# Altium footprint library Wurth_Elektronik_Electromechanic_Wire_to_Board_Connectors_rev16a.PCBLIB: 662 footprints (part 11 of 42)
Each footprint in its own frame and in the unit in brackets; x right, y up, seen from the top. Pads: shape width x height; smd on the part's side, far side on the other; paste and mask are expansions set on the pad; w line width, h text height; cw(c..) or ccw(c..) is an arc to the next point about the centre after c.
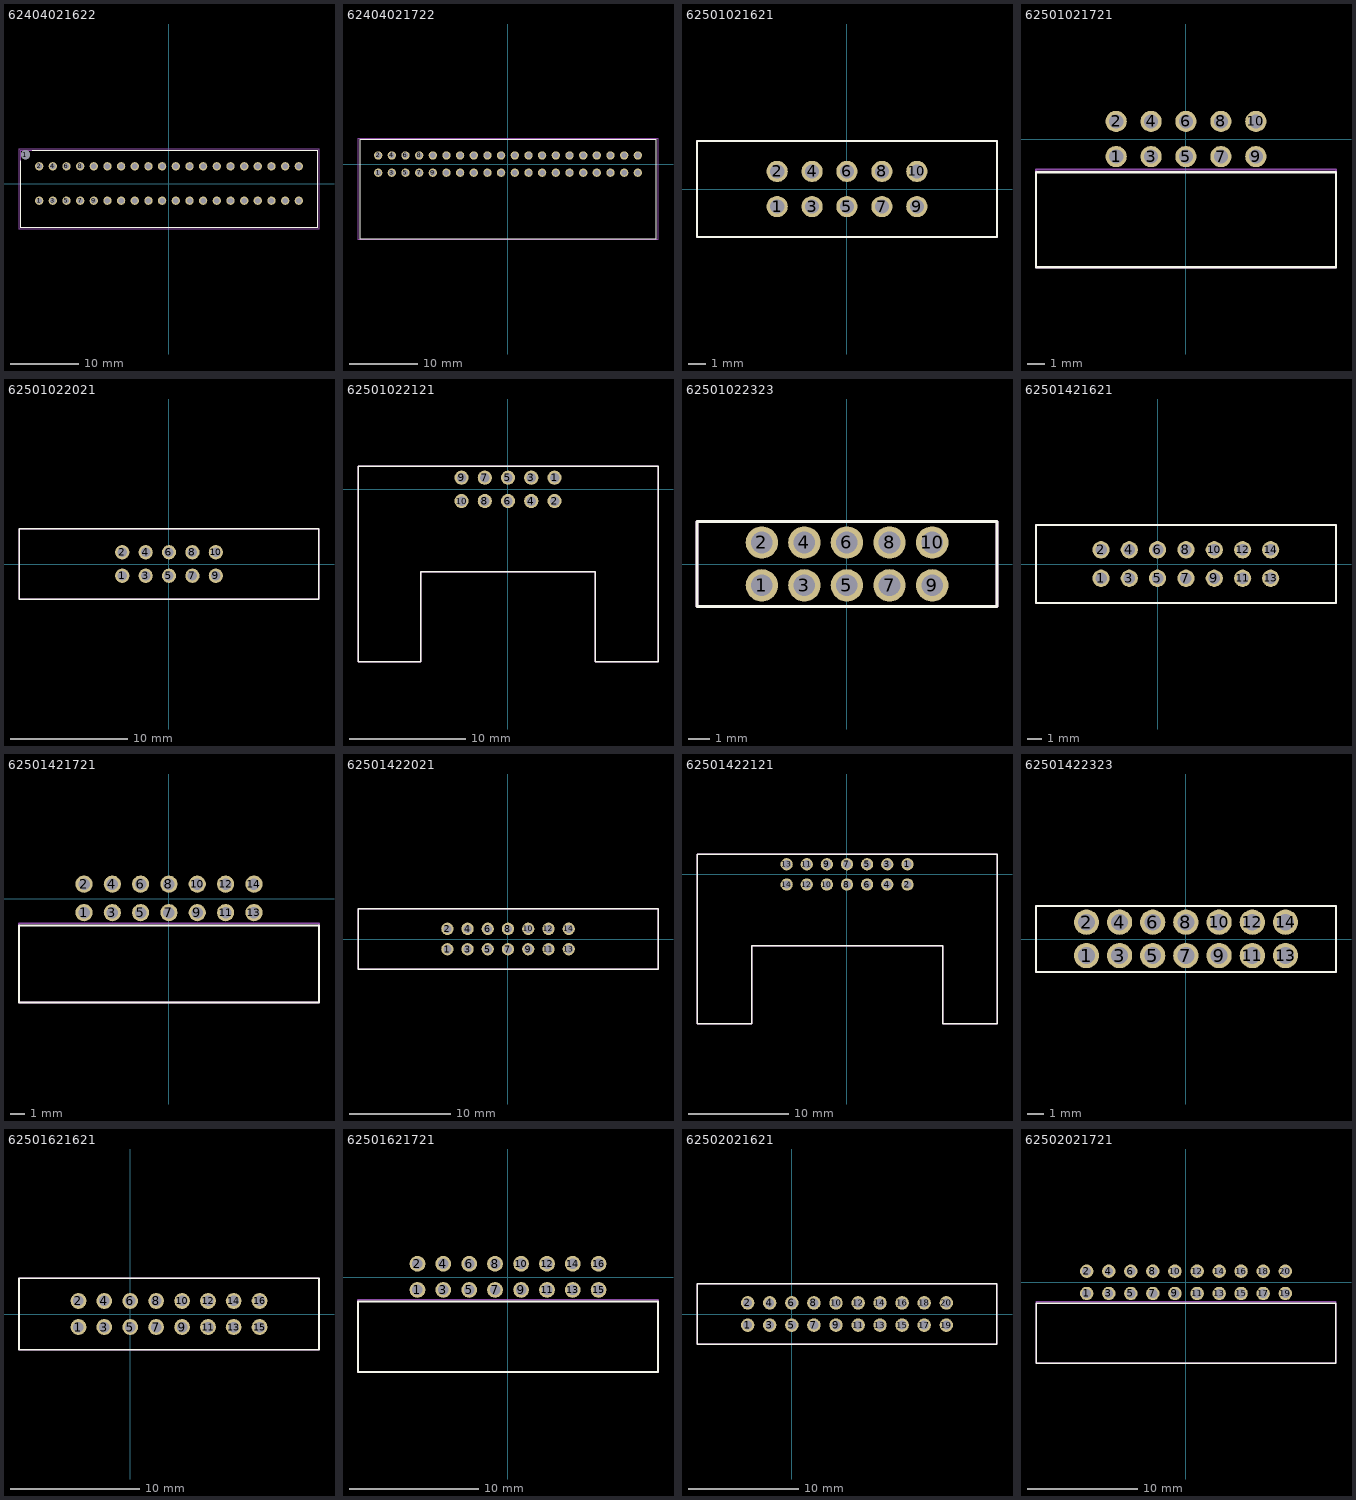
[diagram p10: the footprints below, top view; thin cyan lines are the x and y axes]

## 62404021622 [mil]
pads (41):
  round 52 hole 52: 1(-826.77,166)
  round 48 hole 32: 1(-748.03,-98.43) 2(-748.03,99) 3(-669.29,-98.43) 4(-669.29,99) 5(-590.55,-98.43) 6(-590.55,99) 7(-511.81,-98.43) 8(-511.81,99) 9(-433.07,-98.43) 10(-433.07,99) 11(-354.33,-98.43) 12(-354.33,99) 13(-275.59,-98.43) 14(-275.59,99) 15(-196.85,-98.43) 16(-196.85,99) 17(-118.11,-98.43) 18(-118.11,99) 19(-39.37,-98.43) 20(-39.37,99) 21(40,-98.43) 22(40,99) 23(119,-98.43) 24(119,99) 25(197,-98.43) 26(197,99) 27(276,-98.43) 28(276,99) 29(355,-98.43) 30(355,99) 31(434,-98.43) 32(434,99) 33(512,-98.43) 34(512,99) 35(591,-98.43) 36(591,99) 37(670,-98.43) 38(670,99) 39(749,-98.43) 40(749,99)
Top Overlay:
  lines w5: -854.33,131 -854.33,-253.94 855,-253.94 855,191 -788.58,191
Mechanical 2:
  text ">NAME" at -136.47,249 h77.5
Mechanical 4:
  text ">VALUE" at -141.16,-348.1 h77.5
Mechanical 16:
  lines w5: -854.33,-253.94 855,-253.94 855,191 -854.33,191 -854.33,-253.94
Mechanical 27:
  lines w5: -864.17,-263.78 865,-263.78 865,201 -864.17,201 -864.17,-263.78

## 62404021722 [mil]
pads (40):
  round 48 hole 32: 1(-748.03,-49.21) 2(-748.03,50) 3(-669.29,-49.21) 4(-669.29,50) 5(-590.55,-49.21) 6(-590.55,50) 7(-511.81,-49.21) 8(-511.81,50) 9(-433.07,-49.21) 10(-433.07,50) 11(-354.33,-49.21) 12(-354.33,50) 13(-275.59,-49.21) 14(-275.59,50) 15(-196.85,-49.21) 16(-196.85,50) 17(-118.11,-49.21) 18(-118.11,50) 19(-39.37,-49.21) 20(-39.37,50) 21(40,-49.21) 22(40,50) 23(119,-49.21) 24(119,50) 25(197,-49.21) 26(197,50) 27(276,-49.21) 28(276,50) 29(355,-49.21) 30(355,50) 31(434,-49.21) 32(434,50) 33(512,-49.21) 34(512,50) 35(591,-49.21) 36(591,50) 37(670,-49.21) 38(670,50) 39(749,-49.21) 40(749,50)
Top Overlay:
  lines w5: -854.33,-431.1 855,-431.1 855,140 -854.33,140 -854.33,-431.1
Mechanical 2:
  text ">NAME" at -149.61,203 h77.5
Mechanical 4:
  text ">VALUE" at -140.35,-535.43 h77.5
Mechanical 16:
  text "1" at -781.5,-39.37 h77.5
  text "40" at 703,20 h77.5
Mechanical 27:
  lines w5: -864.17,-437.01 865,-437.01 865,150 -864.17,150 -864.17,-437.01

## 62501021621 [mil]
pads (10):
  round 48 hole 32: 1(-157.48,-39.37) 2(-157.48,40) 3(-78.74,-39.37) 4(-78.74,40) 5(0,-39.37) 6(0,40) 7(79,-39.37) 8(79,40) 9(158,-39.37) 10(158,40)
Top Overlay:
  lines w5: -338.58,-108.27 339,-108.27 339,109 -338.58,109 -338.58,-108.27
Mechanical 2:
  text ">NAME" at -118.11,138 h77.5
Mechanical 4:
  text ">VALUE" at -118.11,-177.17 h77.5
Mechanical 16:
  lines w5: -338.58,-108.27 -338.58,109 339,109 339,-108.27 -338.58,-108.27
  text "1" at -177.17,-59.06 h77.5
  text "10" at 119,20 h77.5

## 62501021721 [mil]
pads (10):
  round 48 hole 32: 1(-157.48,-39.37) 2(-157.48,40) 3(-78.74,-39.37) 4(-78.74,40) 5(0,-39.37) 6(0,40) 7(79,-39.37) 8(79,40) 9(158,-39.37) 10(158,40)
Top Overlay:
  lines w5: -338.58,-289.37 339,-289.37 339,-74.8 -338.58,-74.8 -338.58,-289.37
Mechanical 2:
  text ">NAME" at -639.76,-143.9 h77.5
Mechanical 4:
  text ">VALUE" at -644.29,-227.95 h77.5
Mechanical 16:
  lines w5: -338.58,-289.37 -338.58,-68.9 339,-68.9 339,-289.37 -338.58,-289.37
  text "1" at -202.17,-77.95 h77.5
  text "10" at 144,20 h77.5

## 62501022021 [mil]
pads (10):
  round 48 hole 32: 1(-157.48,-39.37) 2(-157.48,40) 3(-78.74,-39.37) 4(-78.74,40) 5(0,-39.37) 6(0,40) 7(79,-39.37) 8(79,40) 9(158,-39.37) 10(158,40)
Top Overlay:
  lines w5: -505.91,-118.11 506,-118.11 506,119 -505.91,119 -505.91,-118.11
Mechanical 2:
  text ">NAME" at -118.11,138 h77.5
Mechanical 4:
  text ">VALUE" at -118.11,-177.17 h77.5
Mechanical 16:
  lines w5: -505.91,-118.11 -505.91,119 506,119 506,-118.11 -505.91,-118.11
  text "1" at -177.17,-59.06 h77.5
  text "10" at 119,20 h77.5

## 62501022121 [mil]
pads (10):
  round 48 hole 32: 1(158,40) 2(158,-39.37) 3(79,40) 4(79,-39.37) 5(0,40) 6(0,-39.37) 7(-78.74,40) 8(-78.74,-39.37) 9(-157.48,40) 10(-157.48,-39.37)
Top Overlay:
  lines w5: -508.86,-584.65 -295.28,-584.65 -295.28,-279.53 296,-279.53 296,-584.65 509,-584.65 509,79 -508.86,79 -508.86,-584.65
Mechanical 2:
  text ">NAME" at -809.84,-267.32 h77.5
Mechanical 4:
  text ">VALUE" at -821.65,-191.54 h77.5
Mechanical 16:
  lines w5: -508.86,-584.65 -508.86,79 509,79 509,-584.65 296,-584.65 296,-279.53 -295.28,-279.53 -295.28,-584.65 -508.86,-584.65
  text "1" at 141,16 h77.5
  text "10" at -198.43,-55.31 h77.5

## 62501022323 [mil]
pads (10):
  round 60 hole 40: 1(-157.48,-39.37) 2(-157.48,40) 3(-78.74,-39.37) 4(-78.74,40) 5(0,-39.37) 6(0,40) 7(79,-39.37) 8(79,40) 9(158,-39.37) 10(158,40)
Top Overlay:
  lines w5: -277.56,-78.74 278,-78.74 278,79 -277.56,79 -277.56,-78.74
Mechanical 2:
  text ">NAME" at -118.11,113 h77.5
Mechanical 4:
  text ">VALUE" at -118.11,-152.17 h77.5
Mechanical 16:
  lines w5: -277.56,-78.74 -277.56,79 278,79 278,-78.74 -277.56,-78.74
  text "1" at -177.17,-59.06 h77.5
  text "10" at 119,20 h77.5

## 62501421621 [mil]
pads (14):
  round 48 hole 32: 1(-157.48,-39.37) 2(-157.48,40) 3(-78.74,-39.37) 4(-78.74,40) 5(0,-39.37) 6(0,40) 7(79,-39.37) 8(79,40) 9(158,-39.37) 10(158,40) 11(237,-39.37) 12(237,40) 13(315,-39.37) 14(315,40)
Top Overlay:
  lines w5: -338.58,-108.27 497,-108.27 497,109 -338.58,109 -338.58,-108.27
Mechanical 2:
  text ">NAME" at -36.22,138 h77.5
Mechanical 4:
  text ">VALUE" at -36.22,-177.17 h77.5
Mechanical 16:
  lines w5: -338.58,-108.27 -338.58,109 497,109 497,-108.27 -338.58,-108.27
  text "1" at -177.17,-59.06 h77.5
  text "14" at 282,20 h77.5

## 62501421721 [mil]
pads (14):
  round 48 hole 32: 1(-236.22,-39.37) 2(-236.22,40) 3(-157.48,-39.37) 4(-157.48,40) 5(-78.74,-39.37) 6(-78.74,40) 7(0,-39.37) 8(0,40) 9(79,-39.37) 10(79,40) 11(158,-39.37) 12(158,40) 13(237,-39.37) 14(237,40)
Top Overlay:
  lines w5: -417.32,-289.37 418,-289.37 418,-74.8 -417.32,-74.8 -417.32,-289.37
Mechanical 2:
  text ">NAME" at -668.11,-212.2 h77.5
Mechanical 4:
  text ">VALUE" at -707.48,-152.17 h77.5
Mechanical 16:
  lines w5: -417.32,-289.37 -417.32,-68.9 418,-68.9 418,-289.37 -417.32,-289.37
  text "1" at -280.91,-59.06 h77.5
  text "14" at 204,20 h77.5

## 62501422021 [mil]
pads (14):
  round 48 hole 32: 1(-236.22,-39.37) 2(-236.22,40) 3(-157.48,-39.37) 4(-157.48,40) 5(-78.74,-39.37) 6(-78.74,40) 7(0,-39.37) 8(0,40) 9(79,-39.37) 10(79,40) 11(158,-39.37) 12(158,40) 13(237,-39.37) 14(237,40)
Top Overlay:
  lines w5: -584.65,-118.11 585,-118.11 585,119 -584.65,119 -584.65,-118.11
Mechanical 2:
  text ">NAME" at -114.96,138 h77.5
Mechanical 4:
  text ">VALUE" at -114.96,-177.17 h77.5
Mechanical 16:
  lines w5: -584.65,-118.11 -584.65,119 585,119 585,-118.11 -584.65,-118.11
  text "1" at -255.91,-59.06 h77.5
  text "14" at 204,20 h77.5

## 62501422121 [mil]
pads (14):
  round 48 hole 32: 1(237,40) 2(237,-39.37) 3(158,40) 4(158,-39.37) 5(79,40) 6(79,-39.37) 7(0,40) 8(0,-39.37) 9(-78.74,40) 10(-78.74,-39.37) 11(-157.48,40) 12(-157.48,-39.37) 13(-236.22,40) 14(-236.22,-39.37)
Top Overlay:
  lines w5: -587.6,-584.65 -374.02,-584.65 -374.02,-279.53 375,-279.53 375,-584.65 588,-584.65 588,79 -587.6,79 -587.6,-584.65
Mechanical 2:
  text ">NAME" at -881.1,-167.32 h77.5
Mechanical 4:
  text ">VALUE" at -917.91,-241.54 h77.5
Mechanical 16:
  lines w5: -587.6,-584.65 -587.6,79 588,79 588,-584.65 375,-584.65 375,-279.53 -374.02,-279.53 -374.02,-584.65 -587.6,-584.65
  text "1" at 220,16 h77.5
  text "14" at -294.69,-55.31 h77.5

## 62501422323 [mil]
pads (14):
  round 60 hole 40: 1(-236.22,-39.37) 2(-236.22,40) 3(-157.48,-39.37) 4(-157.48,40) 5(-78.74,-39.37) 6(-78.74,40) 7(0,-39.37) 8(0,40) 9(79,-39.37) 10(79,40) 11(158,-39.37) 12(158,40) 13(237,-39.37) 14(237,40)
Top Overlay:
  lines w5: -356.3,-78.74 357,-78.74 357,79 -356.3,79 -356.3,-78.74
Mechanical 2:
  text ">NAME" at -114.96,113 h77.5
Mechanical 4:
  text ">VALUE" at -114.96,-152.17 h77.5
Mechanical 16:
  lines w5: -356.3,-78.74 -356.3,79 357,79 357,-78.74 -356.3,-78.74
  text "1" at -255.91,-59.06 h77.5
  text "14" at 204,20 h77.5

## 62501621621 [mil]
pads (16):
  round 48 hole 32: 1(-157.48,-39.37) 2(-157.48,40) 3(-78.74,-39.37) 4(-78.74,40) 5(0,-39.37) 6(0,40) 7(79,-39.37) 8(79,40) 9(158,-39.37) 10(158,40) 11(237,-39.37) 12(237,40) 13(315,-39.37) 14(315,40) 15(394,-39.37) 16(394,40)
Top Overlay:
  lines w5: -338.58,-108.27 575,-108.27 575,109 -338.58,109 -338.58,-108.27
Mechanical 2:
  text ">NAME" at -36.22,138 h77.5
Mechanical 4:
  text ">VALUE" at -36.22,-177.17 h77.5
Mechanical 16:
  lines w5: -338.58,-108.27 -338.58,109 575,109 575,-108.27 -338.58,-108.27
  text "1" at -177.17,-59.06 h77.5
  text "16" at 357,20 h77.5

## 62501621721 [mil]
pads (16):
  round 48 hole 32: 1(-275.59,-39.37) 2(-275.59,40) 3(-196.85,-39.37) 4(-196.85,40) 5(-118.11,-39.37) 6(-118.11,40) 7(-39.37,-39.37) 8(-39.37,40) 9(40,-39.37) 10(40,40) 11(119,-39.37) 12(119,40) 13(197,-39.37) 14(197,40) 15(276,-39.37) 16(276,40)
Top Overlay:
  lines w5: -456.69,-289.37 457,-289.37 457,-74.8 -456.69,-74.8 -456.69,-289.37
Mechanical 2:
  text ">NAME" at -720.28,-155.31 h77.5
Mechanical 4:
  text ">VALUE" at -745.28,-220.28 h77.5
Mechanical 16:
  lines w5: -456.69,-289.37 -456.69,-68.9 457,-68.9 457,-289.37 -456.69,-289.37
  text "1" at -295.28,-59.06 h77.5
  text "16" at 239,20 h77.5

## 62502021621 [mil]
pads (20):
  round 48 hole 32: 1(-157.48,-39.37) 2(-157.48,40) 3(-78.74,-39.37) 4(-78.74,40) 5(0,-39.37) 6(0,40) 7(79,-39.37) 8(79,40) 9(158,-39.37) 10(158,40) 11(237,-39.37) 12(237,40) 13(315,-39.37) 14(315,40) 15(394,-39.37) 16(394,40) 17(473,-39.37) 18(473,40) 19(552,-39.37) 20(552,40)
Top Overlay:
  lines w5: -338.58,-108.27 733,-108.27 733,109 -338.58,109 -338.58,-108.27
Mechanical 2:
  text ">NAME" at 114,138 h77.5
Mechanical 4:
  text ">VALUE" at 89,-177.17 h77.5
Mechanical 16:
  lines w5: -338.58,-108.27 -338.58,109 733,109 733,-108.27 -338.58,-108.27
  text "1" at -177.17,-59.06 h77.5
  text "20" at 532,20 h77.5

## 62502021721 [mil]
pads (20):
  round 48 hole 32: 1(-354.33,-39.37) 2(-354.33,40) 3(-275.59,-39.37) 4(-275.59,40) 5(-196.85,-39.37) 6(-196.85,40) 7(-118.11,-39.37) 8(-118.11,40) 9(-39.37,-39.37) 10(-39.37,40) 11(40,-39.37) 12(40,40) 13(119,-39.37) 14(119,40) 15(197,-39.37) 16(197,40) 17(276,-39.37) 18(276,40) 19(355,-39.37) 20(355,40)
Top Overlay:
  lines w5: -535.43,-289.37 536,-289.37 536,-74.8 -535.43,-74.8 -535.43,-289.37
Mechanical 2:
  text ">NAME" at -791.73,-157.48 h77.5
Mechanical 4:
  text ">VALUE" at -816.73,-236.22 h77.5
Mechanical 16:
  lines w5: -535.43,-289.37 -535.43,-68.9 536,-68.9 536,-289.37 -535.43,-289.37
  text "1" at -374.02,-59.06 h77.5
  text "20" at 331,20 h77.5